# Altium footprint library VEGG_PcbLib_ALT.PcbLib: 140 footprints (part 6 of 9)
Each footprint in its own frame and in the unit in brackets; x right, y up, seen from the top. Pads: shape width x height; smd on the part's side, far side on the other; paste and mask are expansions set on the pad; w line width, h text height; cw(c..) or ccw(c..) is an arc to the next point about the centre after c.
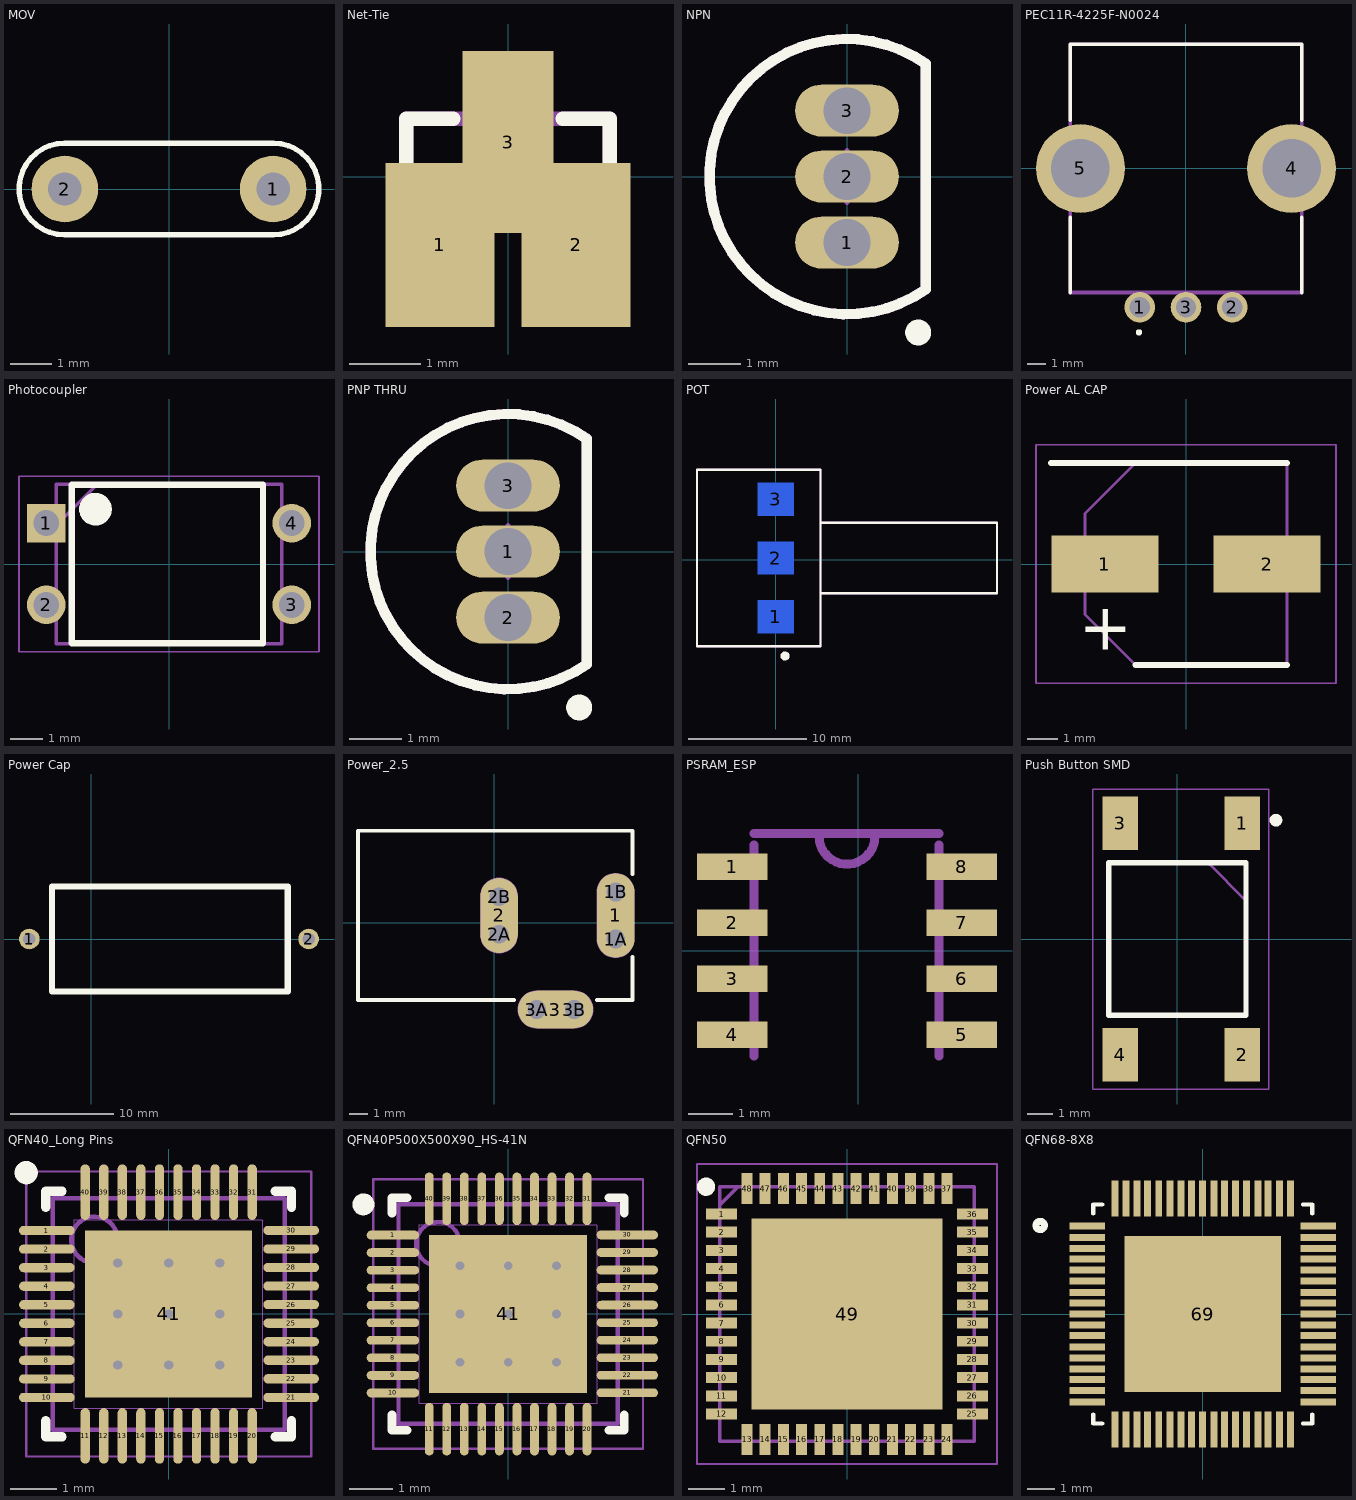
[diagram p5: the footprints below, top view; thin cyan lines are the x and y axes]

## MOV [mm]
pads (2):
  round 1.6 hole 0.8: 1(2.5,0) 2(-2.5,0)
Top Overlay:
  lines w0.127: -2.5,-1.1 cw(c-2.5,0) -2.5,1.1 2.5,1.1 cw(c2.5,0) 2.5,-1.1 -2.5,-1.1

## Net-Tie [mil]
pads (3):
  rect 60x90 smd: 1(-37.5,-37.5) 2(37.31,-37.5)
  rect 50x100 smd: 3(0,19)
Top Overlay:
  lines w8: -56.1,-0.19 -56.1,31.81 -30.16,31.81 ; 29.97,31.81 55.9,31.81 55.9,-0.19
Mechanical 4:
  region: -46.12,-22.19 -28.1,-22.19 -28.1,-45.22 -46.12,-45.22
  region: 27.91,-22.19 45.9,-22.19 45.9,-45.19 27.91,-45.19
  region: -9.1,56.81 8.9,56.81 8.9,33.83 -9.1,33.83
  region: -46.12,-22.19 -28.1,-22.19 -28.1,-45.22 -46.12,-45.22
  region: 27.91,-22.19 45.9,-22.19 45.9,-45.19 27.91,-45.19
  region: -9.1,56.81 8.9,56.81 8.9,33.83 -9.1,33.83
  lines w8: -56.1,31.81 -56.1,-20.19 -56.1,31.81 ; -56.1,31.81 55.9,31.81 ; -56.1,31.81 55.9,31.81 ; 55.9,31.81 55.9,-20.19 55.9,31.81

## NPN [mm]
pads (3):
  oval 2x1 hole 0.9: 1(0,-1.27) 2(0,0) 3(0,1.27)
Top Overlay:
  circle w0.25: c1.371,-3.003 r0.125
  lines w0.2: 1.52,-2.171 cw(c0,0) 1.52,2.171 1.52,-2.171
Mechanical 13:
  lines w0.2: 1.52,-2.171 cw(c0,0) 1.52,2.171 1.52,-2.171
Mechanical 15:
  lines w0.1: -0.5,0 0.5,0 ; 0,-0.5 0,0.5
3D body: height 5.33, standoff 0, extent -2.651,-2.661 1.52,2.661

## PEC11R-4225F-N0024 [mm] "rotary encoder dc load"
pads (5):
  round 1.65 hole 1.1: 1(-2.5,-7.5) 2(2.5,-7.5) 3(0,-7.5)
  round 4.8 hole 3.162: 4(5.7,0) 5(-5.7,0)
Top Overlay:
  circle w0.2: c-2.541,-8.859 r0.071
  lines w0.2: -6.25,-6.7 -6.25,-2.65 ; -6.25,2.6 -6.25,6.7 6.25,6.7 6.25,2.6 ; 6.25,-6.7 6.25,-2.65
Mechanical 13:
  lines w0.2: -6.25,-6.7 -6.25,6.7 6.25,6.7 6.25,-6.7 -6.25,-6.7
3D body "PEC11R-4215K-N0024.stp": height 21.1, standoff -4.1, extent -7,-7.7 7,7.2

## Photocoupler [mm] "PS2501"
pads (4):
  rect 1.2x1.2 / inner round 1.2 / far side rect 1.2x1.2 hole 0.8: 1(-3.81,1.27)
  round 1.2 hole 0.8: 2(-3.81,-1.27) 3(3.81,-1.27) 4(3.81,1.27)
Top Overlay:
  circle w0.508: c-2.286,1.702 r0.254
  lines w0.2: -3.023,-2.464 -3.023,2.464 2.921,2.464 2.921,-2.464 -2.972,-2.464
Mechanical 15:
  lines w0.1: -3.5,1.205 -2.23,2.475 ; -3.5,-2.475 3.5,-2.475 3.5,2.475 -3.5,2.475 -3.5,-2.475
Mechanical 20:
  lines w0.05: -4.66,-2.725 4.66,-2.725 4.66,2.725 -4.66,2.725 -4.66,-2.725
3D body "PS2501-1-A.stp": height 4.55, standoff -3.5, extent -3.96,-2.3 3.96,2.3

## PNP THRU [mm]
pads (3):
  oval 2x1 hole 0.9: 1(0,0) 2(0,-1.27) 3(0,1.27)
Top Overlay:
  circle w0.25: c1.371,-3.003 r0.125
  lines w0.2: 1.52,-2.171 cw(c0,0) 1.52,2.171 1.52,-2.171
Mechanical 13:
  lines w0.2: 1.52,-2.171 cw(c0,0) 1.52,2.171 1.52,-2.171
Mechanical 15:
  lines w0.1: -0.5,0 0.5,0 ; 0,-0.5 0,0.5
3D body: height 5.33, standoff 0, extent -2.651,-2.661 1.52,2.661

## POT [mil]
pads (3):
  rect 120x110 smd far side: 1(0.39,-191.85) 2(0.39,5) 3(0.39,201.85)
Top Overlay:
  circle w15.75: c31.22,-322.83 r7.42
  lines w7.87: 150,-113.11 740.55,-113.11 740.55,123.11 150,123.11 ; -263.39,-290.28 -263.39,300.28 150,300.28 150,-290.28 -263.39,-290.28
Mechanical 15:
  lines w7.87: 150,-113.11 740.55,-113.11 740.55,123.11 150,123.11 ; -263.39,-290.28 150,-290.28 150,300.28 -263.39,300.28 -263.39,-290.28
3D body "POTENCIOMETRO B10K.SLDPRT": height 780.71, standoff -60.63, extent -115,-328.86 835.39,338.86

## Power AL CAP [mm]
pads (2):
  rect 3.5x1.85 smd: 1(-2.65,0) 2(2.65,0)
Top Overlay:
  lines w0.2: -4.4,3.3 3.3,3.3 ; -1.65,-3.3 3.3,-3.3
  text "+" at -3.505,-2.794 h1.52
Mechanical 13:
  lines w0.1: -3.3,-1.65 -3.3,1.65 -1.65,3.3 3.3,3.3 3.3,-3.3 -1.65,-3.3 -3.3,-1.65
Mechanical 15:
  lines w0.05: -4.9,-3.9 4.9,-3.9 4.9,3.9 -4.9,3.9 -4.9,-3.9
3D body "UWT1C221MCL1GS.stp": height 8.2, standoff 0, extent -3.7,-3.4 3.7,3.4

## Power Cap [mm]
pads (2):
  round 2 hole 1.2: 1(-6,0) 2(21.082,0)
Top Overlay:
  lines w0.6: -3.81,-5.08 -3.81,5.08 10.16,5.08 19.05,5.08 19.05,-5.08 -3.81,-5.08
3D body: height 0.25, standoff 0, extent -3.048,8.128 -3.048,8.128
3D body: height 0.25, standoff 0, extent -3.048,8.128 -3.048,8.128

## Power_2.5 [mm] "2.5 mm DC female jack"
pads (9):
  oval 2x4.5 all layers, no hole: 1(6.461,0.381)
  round 1.5 hole 1: 1A(6.461,-0.869) 1B(6.461,1.631) 2A(0.261,-0.619) 2B(0.261,1.381) 3A(2.261,-4.619) 3B(4.261,-4.619)
  oval 2x4 all layers, no hole: 2(0.261,0.381)
  oval 4x2 all layers, no hole: 3(3.261,-4.619)
Top Overlay:
  lines w0.2: 1.061,-4.119 -7.239,-4.119 -7.239,4.881 7.361,4.881 7.361,2.581 ; 5.461,-4.119 7.361,-4.119 7.361,-1.819
Mechanical 1:
  lines w1: 0.261,-0.619 0.261,1.381 ; 2.261,-4.619 4.261,-4.619 ; 6.461,-0.869 6.461,1.631
Mechanical 2:
  lines w2.016: 0.261,-0.619 0.261,1.381 ; 2.261,-4.619 4.261,-4.619 ; 6.461,-0.869 6.461,1.631
3D body "CUI_PJ-050A.step": height 11, standoff -2.2, extent -7.415,-4.75 6.985,4.75

## PSRAM_ESP [mm] "sop8"
pads (8):
  rect 1.6x0.6 smd: 1(-2.854,1.905) 2(-2.854,0.635) 3(-2.854,-0.635) 4(-2.854,-1.905) 5(2.346,-1.905) 6(2.346,-0.635) 7(2.346,0.635) 8(2.346,1.905)
Mechanical 9:
  region: -3.354,2.155 -2.454,2.155 -2.454,1.655 -3.354,1.655
  region: -3.354,0.885 -2.454,0.885 -2.454,0.385 -3.354,0.385
  region: -3.354,-0.385 -2.454,-0.385 -2.454,-0.885 -3.354,-0.885
  region: -3.354,-1.655 -2.454,-1.655 -2.454,-2.155 -3.354,-2.155
  region: 1.946,-1.655 2.846,-1.655 2.846,-2.155 1.946,-2.155
  region: 1.946,-0.385 2.846,-0.385 2.846,-0.885 1.946,-0.885
  region: 1.946,0.885 2.846,0.885 2.846,0.385 1.946,0.385
  region: 1.946,2.155 2.846,2.155 2.846,1.655 1.946,1.655
  lines w0.203: -2.364,-2.395 -2.364,2.395 ; 1.831,-2.395 1.831,2.395
Mechanical 23:
  lines w0.203: -2.364,2.649 1.831,2.649 ; -0.889,2.594 ccw(c-0.254,2.594) 0.381,2.594
3D body: height 1.27, standoff 0, extent -3.654,1.605 -2.054,2.205
3D body: height 1.27, standoff 0, extent -3.654,0.335 -2.054,0.935
3D body: height 1.27, standoff 0, extent -3.654,-0.935 -2.054,-0.335
3D body: height 1.27, standoff 0, extent -3.654,-2.205 -2.054,-1.605
3D body: height 1.27, standoff 0, extent 1.546,-2.205 3.146,-1.605
3D body: height 1.27, standoff 0, extent 1.546,-0.935 3.146,-0.335
3D body: height 1.27, standoff 0, extent 1.546,0.335 3.146,0.935
3D body: height 1.27, standoff 0, extent 1.546,1.605 3.146,2.205

## Push Button SMD [mm]
pads (4):
  rect 1.4x2.1 smd: 1(2.55,4.55) 2(2.55,-4.55) 3(-2.25,4.55) 4(-2.25,-4.55)
Top Overlay:
  circle w0.25: c3.875,4.675 r0.125
  lines w0.2: -2.7,-3 2.7,-3 2.7,3 -2.7,3 -2.7,-3
Mechanical 15:
  lines w0.1: 1.275,2.925 2.625,1.575 ; -2.7,-3 2.7,-3 2.7,3 -2.7,3 -2.7,-3
Mechanical 20:
  lines w0.05: -3.325,-5.9 3.6,-5.9 3.6,5.9 -3.325,5.9 -3.325,-5.9
3D body "4-1437565-1.stp": height 5.08, standoff 0, extent -2.847,-4.873 3.153,5.127
3D body: height 0.25, standoff 0, extent -6.223,1.651 -6.223,1.651
3D body: height 0.25, standoff 0, extent -7.493,3.175 -7.493,3.175
3D body: height 0.25, standoff 0, extent -7.239,3.048 -7.239,3.048
3D body: height 0.25, standoff 0, extent -7.493,2.667 -7.493,2.667

## QFN40_Long Pins [mm] "xmc1100"
pads (41):
  oval 1.2x0.2 smd: 1(-2.628,1.8) 2(-2.628,1.4) 3(-2.628,1) 4(-2.628,0.6) 5(-2.628,0.2) 6(-2.628,-0.2) 7(-2.628,-0.6) 8(-2.628,-1) 9(-2.628,-1.4) 10(-2.628,-1.8) 21(2.642,-1.8) 22(2.642,-1.397) 23(2.642,-0.997) 24(2.642,-0.597) 25(2.642,-0.197) 26(2.642,0.203) 27(2.642,0.603) 28(2.642,1.003) 29(2.642,1.403) 30(2.642,1.803)
  oval 0.2x1.2 smd: 11(-1.8,-2.628) 12(-1.4,-2.628) 13(-1,-2.628) 14(-0.6,-2.628) 15(-0.2,-2.628) 16(0.2,-2.628) 17(0.6,-2.628) 18(1,-2.628) 19(1.4,-2.628) 20(1.8,-2.628) 31(1.8,2.628) 32(1.4,2.628) 33(1,2.628) 34(0.6,2.628) 35(0.2,2.628) 36(-0.2,2.628) 37(-0.6,2.628) 38(-1,2.628) 39(-1.4,2.628) 40(-1.8,2.628)
  rect 3.6x3.6 smd: 41(0,0)
via 1.1,-1.1 diameter 0.5 hole 0.2
via 0,-1.1 diameter 0.5 hole 0.2
via -1.1,-1.1 diameter 0.5 hole 0.2
via 1.1,0 diameter 0.5 hole 0.2
via 0,0 diameter 0.5 hole 0.2
via -1.1,0 diameter 0.5 hole 0.2
via 1.1,1.1 diameter 0.5 hole 0.2
via 0,1.1 diameter 0.5 hole 0.2
via -1.1,1.1 diameter 0.5 hole 0.2
Top Overlay:
  circle w0.25: c-3.073,3.048 r0.125
  lines w0.2: -2.65,-2.3 -2.65,-2.65 -2.3,-2.65 ; -2.65,2.3 -2.65,2.65 -2.3,2.65 ; 2.3,-2.65 2.65,-2.65 2.65,-2.3 ; 2.3,2.65 2.65,2.65 2.65,2.3
Mechanical 4:
  lines w0.025: -2.032,-2.032 2.032,-2.032 2.032,2.007 2.007,2.032 -1.803,2.032 -2.032,2.032 -2.032,-2.032
Mechanical 13:
  circle w0.1: c-1.6,1.6 r0.5
  lines w0.1: -2.5,-2.5 2.5,-2.5 2.5,2.5 -2.5,2.5 -2.5,-2.5
Mechanical 15:
  lines w0.05: -3.075,-3.075 3.075,-3.075 3.075,3.075 -3.075,3.075 -3.075,-3.075
  lines w0.1: -0.5,0 0.5,0 ; 0,-0.5 0,0.5
3D body "QFN40P500X500X90_HS-41N.step": height 0.9, standoff 0, extent -2.55,-2.55 2.55,2.55

## QFN40P500X500X90_HS-41N [mm] "QFN, 40-Leads, Body 5.00x5.00mm, Pitch 0.40mm, Thermal Pad 3.60x3.60mm, IPC Medium Density"
height 0.9
pads (41):
  oval 1.2x0.2 smd: 1(-2.628,1.8) 2(-2.628,1.4) 3(-2.628,1) 4(-2.628,0.6) 5(-2.628,0.2) 6(-2.628,-0.2) 7(-2.628,-0.6) 8(-2.628,-1) 9(-2.628,-1.4) 10(-2.628,-1.8)
  oval 0.2x1.2 smd: 11(-1.8,-2.628) 12(-1.4,-2.628) 13(-1,-2.628) 14(-0.6,-2.628) 15(-0.2,-2.628) 16(0.2,-2.628) 17(0.6,-2.628) 18(1,-2.628) 19(1.4,-2.628) 20(1.8,-2.628) 31(1.8,2.628) 32(1.4,2.628) 33(1,2.628) 34(0.6,2.628) 35(0.2,2.628) 36(-0.2,2.628) 37(-0.6,2.628) 38(-1,2.628) 39(-1.4,2.628) 40(-1.8,2.628)
  oval 1.4x0.2 smd: 21(2.718,-1.797) 22(2.718,-1.397) 23(2.718,-0.997) 24(2.718,-0.597) 25(2.718,-0.197) 26(2.718,0.203) 27(2.718,0.603) 28(2.718,1.003) 29(2.718,1.403) 30(2.718,1.803)
  rect 3.6x3.6 smd: 41(0,0)
via -1.1,1.1 diameter 0.5 hole 0.2
via 0,1.1 diameter 0.5 hole 0.2
via 1.1,1.1 diameter 0.5 hole 0.2
via -1.1,0 diameter 0.5 hole 0.2
via 0,0 diameter 0.5 hole 0.2
via 1.1,0 diameter 0.5 hole 0.2
via -1.1,-1.1 diameter 0.5 hole 0.2
via 0,-1.1 diameter 0.5 hole 0.2
via 1.1,-1.1 diameter 0.5 hole 0.2
Top Overlay:
  circle w0.25: c-3.3,2.5 r0.125
  lines w0.2: -2.65,-2.3 -2.65,-2.65 -2.3,-2.65 ; -2.65,2.3 -2.65,2.65 -2.3,2.65 ; 2.3,-2.65 2.65,-2.65 2.65,-2.3 ; 2.3,2.65 2.65,2.65 2.65,2.3
Mechanical 4:
  lines w0.025: -2.032,-2.032 -2.032,2.032 -1.803,2.032 2.007,2.032 2.032,2.007 2.032,-2.032 -2.032,-2.032
Mechanical 13:
  circle w0.1: c-1.6,1.6 r0.5
  lines w0.1: -2.5,-2.5 -2.5,2.5 2.5,2.5 2.5,-2.5 -2.5,-2.5
Mechanical 15:
  lines w0.05: -3.075,-3.075 -3.075,3.075 3.075,3.075 3.075,-3.075 -3.075,-3.075
  lines w0.1: -0.5,0 0.5,0 ; 0,-0.5 0,0.5
3D body "QFN40P500X500X90_HS-41N.step": height 0.9, standoff 0, extent -2.55,-2.55 2.55,2.55

## QFN50 [mm]
pads (49):
  rect 0.85x0.3 smd: 1(-3.45,2.75) 2(-3.45,2.25) 3(-3.45,1.75) 4(-3.45,1.25) 5(-3.45,0.75) 6(-3.45,0.25) 7(-3.45,-0.25) 8(-3.45,-0.75) 9(-3.45,-1.25) 10(-3.45,-1.75) 11(-3.45,-2.25) 12(-3.45,-2.75) 25(3.45,-2.75) 26(3.45,-2.25) 27(3.45,-1.75) 28(3.45,-1.25) 29(3.45,-0.75) 30(3.45,-0.25) 31(3.45,0.25) 32(3.45,0.75) 33(3.45,1.25) 34(3.45,1.75) 35(3.45,2.25) 36(3.45,2.75)
  rect 0.3x0.85 smd: 13(-2.75,-3.45) 14(-2.25,-3.45) 15(-1.75,-3.45) 16(-1.25,-3.45) 17(-0.75,-3.45) 18(-0.25,-3.45) 19(0.25,-3.45) 20(0.75,-3.45) 21(1.25,-3.45) 22(1.75,-3.45) 23(2.25,-3.45) 24(2.75,-3.45) 37(2.75,3.45) 38(2.25,3.45) 39(1.75,3.45) 40(1.25,3.45) 41(0.75,3.45) 42(0.25,3.45) 43(-0.25,3.45) 44(-0.75,3.45) 45(-1.25,3.45) 46(-1.75,3.45) 47(-2.25,3.45) 48(-2.75,3.45)
  rect 5.25x5.25 smd: 49(0,0)
Top Overlay:
  circle w0.25: c-3.875,3.5 r0.125
Mechanical 13:
  lines w0.1: -3.5,3 -3,3.5 ; -3.5,-3.5 3.5,-3.5 3.5,3.5 -3.5,3.5 -3.5,-3.5
Mechanical 15:
  lines w0.05: -4.125,-4.125 4.125,-4.125 4.125,4.125 -4.125,4.125 -4.125,-4.125
3D body "CC1312R1F3RGZT.stp": height 1, standoff 0, extent -3.55,-3.55 3.55,3.55

## QFN68-8X8 [mil]
pads (69):
  rect 51.18x10 smd: 1(-165.59,126) 2(-165.59,110) 3(-165.59,94) 4(-165.59,79) 5(-165.59,63) 6(-165.59,47) 7(-165.59,31) 8(-165.59,16) 9(-165.59,0) 10(-165.59,-16) 11(-165.59,-31) 12(-165.59,-47) 13(-165.59,-63) 14(-165.59,-79) 15(-165.59,-94) 16(-165.59,-110) 17(-165.59,-126) 35(165.59,-126) 36(165.59,-110) 37(165.59,-94) 38(165.59,-79) 39(165.59,-63) 40(165.59,-47) 41(165.59,-31) 42(165.59,-16) 43(165.59,0) 44(165.59,16) 45(165.59,31) 46(165.59,47) 47(165.59,63) 48(165.59,79) 49(165.59,94) 50(165.59,110) 51(165.59,126)
  rect 10x51.18 smd: 18(-126,-165.59) 19(-110,-165.59) 20(-94,-165.59) 21(-79,-165.59) 22(-63,-165.59) 23(-47,-165.59) 24(-31,-165.59) 25(-16,-165.59) 26(0,-165.59) 27(16,-165.59) 28(31,-165.59) 29(47,-165.59) 30(63,-165.59) 31(79,-165.59) 32(94,-165.59) 33(110,-165.59) 34(126,-165.59) 52(126,165.59) 53(110,165.59) 54(94,165.59) 55(79,165.59) 56(63,165.59) 57(47,165.59) 58(31,165.59) 59(16,165.59) 60(0,165.59) 61(-16,165.59) 62(-31,165.59) 63(-47,165.59) 64(-63,165.59) 65(-79,165.59) 66(-94,165.59) 67(-110,165.59) 68(-126,165.59)
  rect 224x224 smd: 69(0,0)
Top Overlay:
  circle w10: c-233,127 r6
  lines w6: -157,-144 -157,-157 -144,-157 ; -157,144 -157,157 -144,157 ; 144,-157 157,-157 157,-144 ; 144,157 157,157 157,144
3D body "User Library-QFN68(8x8mm).X_T": height 35, standoff 1.54, extent -158.27,-156.26 158.27,160.28